# Altium schematic symbol library IC_ADI.SCHLIB: 3169 symbols (part 57 of 181) (continued)
## AD7549JP
designator U?
Dual 12-Bit uP-Compatible Digital-to-Analog Converter, 0 to +70 degC, P-20A, Tube; Generic Part Number: AD7549; PartNumber: AD7549JP; # DAC Outputs: 2; Max V+: 15.75V; Op Pwr Diss: 75mW; Resolution (Bits): 12; Settling Time: 1.5祍; Single Supply: Yes; DatasheetVersion: Rev.A; PackageVersion: Nov-2002; PackageReference: P-20A; PackageDescription: 20-Lead Plastic Leaded Chip Carrier [PLCC]; Supplier Part Number 1: AD7549JP-ND; Supplier Part Number 2: 584-AD7549JP; Packing: Tube; RoHS: N; Mounting Technology: Surface Mount; Code_JEDEC: MO-047-AA; ComponentLink1Description: Manufacturer URL; ComponentLink2Description: Datasheet; ComponentLink3Description: Package Specification; ComponentLink4Description: Product URL
footprint PLCC-20N (Footprint not found)
pins: 1 DB3 (in) "Data Bit 3, Data Bit 7 or Data Bit 11(MSB)", 2 DB2 (in) "Data Bit 2, Data Bit 6 or Data Bit 10.", 3 DB1 (in) "Data Bit 1, Data Bit 5 or Data Bit 9.", 4 DB0 (in) "Data Bit 0, Data Bit 4 or Data Bit 8.", 5 ~{UPD} (in) "Updates DAC Registers from 4-bit input registers. DAC A and DAC B both updated simultaneously.", 6 A2 (in) "Address line 2.", 7 A1 (in) "Address line 1.", 8 A0 (in) "Address line 0.", 9 ~{CS} (in) "Chip Select Input. Active low.", 10 ~{WR} (in) "Write Input. Active low.", 11 CLR (in) "Clear Input. Active High. Clears all registers.", 12 DGND (power) "Digital Ground.", 13 VREFB (in) "Voltage reference input to DAC B.", 14 RFBB (in) "Feedback resistor of DAC B.", 15 IOUTB (out) "Current output terminal of DAC B.", 16 AGND (power) "Analog ground.", 17 IOUTA (out) "Current output terminal of DAC A.", 18 RFBA (in) "Feedback resistor of DAC A.", 19 VREFA (in) "Voltage reference input to DAC A.", 20 VDD (power) "+15 V supply input."

## AD7549KN
designator U?
Dual 12-Bit uP-Compatible Digital-to-Analog Converter, 0 to +70 degC, N-20, Tube; Generic Part Number: AD7549; PartNumber: AD7549KN; # DAC Outputs: 2; Max V+: 15.75V; Op Pwr Diss: 75mW; Resolution (Bits): 12; Settling Time: 1.5祍; Single Supply: Yes; DatasheetVersion: Rev.A; PackageVersion: 070706-A; PackageReference: N-20; PackageDescription: 20-Lead Plastic Dual In-Line Package [PDIP] Narrow Body; Supplier Part Number 1: AD7549KN-ND; Supplier Part Number 2: 584-AD7549KN; Packing: Tube; RoHS: N; Mounting Technology: Through Hole; Code_JEDEC: MS-001; ComponentLink1Description: Manufacturer URL; ComponentLink2Description: Datasheet; ComponentLink3Description: Package Specification; ComponentLink4Description: Product URL
footprint DIP20 (Footprint not found)
pins: 1 DB3 (in) "Data Bit 3,Data Bit 7 or Data Bit 11 (MSB)", 2 DB2 (in) "Data Bit 2,Data Bit 6 or Data Bit 10.", 3 DB1 (in) "Data Bit 1,Data Bit 5 or Data Bit 9.", 4 DB0 (in) "Data Bit 0,Data Bit 4 or Data Bit 8.", 5 ~{UPD} (in) "Updates DAC Registers from 4-bit input registers.DAC A and DAC B both updated simultaneously.", 6 A2 (in) "Address line 2.", 7 A1 (in) "Address line 1.", 8 A0 (in) "Address line 0.", 9 ~{CS} (in) "Chip Sekect Input.Active low.", 10 ~{WR} (in) "Write Input.Active low.", 11 CLR (in) "Clear Input.Active High.Clears all registers.", 12 DGND (power) "Digital Ground.", 13 VREFB (in) "Voltage reference input to DAC B.", 14 RFBB (in) "Feedback resistor of DAC B.", 15 IOUTB (out) "Current output terminal of DAC B.", 16 AGND (power) "Analog ground.", 17 IOUTA (out) "Current output terminal of DAC A.", 18 RFBA (in) "Feedback resistor of DAC A.", 19 VREFA (in) "Voltage reference input to DAC A.", 20 VDD (power) "+15 V supply input."

## AD7549KPZ
designator U?
Dual 12-Bit uP-Compatible Digital-to-Analog Converter, 0 to +70 degC, P-20A, Pb-Free, Tube; Generic Part Number: AD7549; PartNumber: AD7549KPZ; # DAC Outputs: 2; Max V+: 15.75V; Op Pwr Diss: 75mW; Resolution (Bits): 12; Settling Time: 1.5祍; Single Supply: Yes; DatasheetVersion: Rev.A; PackageVersion: Nov-2002; PackageReference: P-20A; PackageDescription: 20-Lead Plastic Leaded Chip Carrier [PLCC]; Supplier Part Number 1: AD7549KPZ-ND; Supplier Part Number 2: 584-AD7549KPZ; Packing: Tube; RoHS: Y; Mounting Technology: Surface Mount; Code_JEDEC: MO-047-AA; ComponentLink1Description: Manufacturer URL; ComponentLink2Description: Datasheet; ComponentLink3Description: Package Specification; ComponentLink4Description: Product URL
footprint PLCC-20N (Footprint not found)
pins: 1 DB3 (in) "Data Bit 3, Data Bit 7 or Data Bit 11(MSB)", 2 DB2 (in) "Data Bit 2, Data Bit 6 or Data Bit 10.", 3 DB1 (in) "Data Bit 1, Data Bit 5 or Data Bit 9.", 4 DB0 (in) "Data Bit 0, Data Bit 4 or Data Bit 8.", 5 ~{UPD} (in) "Updates DAC Registers from 4-bit input registers. DAC A and DAC B both updated simultaneously.", 6 A2 (in) "Address line 2.", 7 A1 (in) "Address line 1.", 8 A0 (in) "Address line 0.", 9 ~{CS} (in) "Chip Select Input. Active low.", 10 ~{WR} (in) "Write Input. Active low.", 11 CLR (in) "Clear Input. Active High. Clears all registers.", 12 DGND (power) "Digital Ground.", 13 VREFB (in) "Voltage reference input to DAC B.", 14 RFBB (in) "Feedback resistor of DAC B.", 15 IOUTB (out) "Current output terminal of DAC B.", 16 AGND (power) "Analog ground.", 17 IOUTA (out) "Current output terminal of DAC A.", 18 RFBA (in) "Feedback resistor of DAC A.", 19 VREFA (in) "Voltage reference input to DAC A.", 20 VDD (power) "+15 V supply input."

## AD7564AR-B
designator U?
Quad 12-Bit Low Power Digital-to-Analog Converter, 3.3 V / 5 V, 0 to 70 degC, RW-28, Tube; Generic Part Number: AD7564; PartNumber: AD7564AR-B; # DAC Outputs: 4; Max V+: 5.5V; Op Pwr Diss: 50礧; Resolution (Bits): 12; Settling Time: 550ns; Single Supply: Yes; DatasheetVersion: Rev.B; PackageVersion: 060706-A; PackageReference: RW-28; PackageDescription: 28-Lead Standard Small Outline Package [SOIC_W]; Supplier Part Number 1: AD7564AR-B-ND; Supplier Part Number 2: 584-AD7564AR-B; Packing: Tube; RoHS: N; Mounting Technology: Surface Mount; Code_JEDEC: MS-013-AE; ComponentLink1Description: Manufacturer URL; ComponentLink2Description: Datasheet; ComponentLink3Description: Product URL
footprint SOIC28W_1.27 (Footprint not found)
pins: 1 DGND (power) "Digital Ground.", 2 IOUT2C "IOUT2 terminal for DAC C. This should normally connect to the signal ground of the system.", 3 VDD (power) "Positive power supply. This is +5 V +/- 5%.", 4 IOUT1C (out) "IOUT1 terminal for DAC C.", 5 RFBC (in) "Feedback resistor for DAC C.", 6 VREFC (in) "DAC C reference input.", 7 IOUT2D "IOUT2 terminal for DAC D. This should normally connect to the signal ground of the system.", 8 IOUT1D (out) "IOUT1 terminal for DAC D.", 9 RFBD (in) "Feedback resistor for DAC D.", 10 VREFD (in) "DAC D reference input.", 11 SDOUT (out) "This shift register output allows multiple devices to be connected in a daisy chain configuration.", 12 ~{CLR} (in) "Asynchronous C\L\R\ input. When this input is taken low, all DAC latches are loaded with all 0s.", 13 ~{LDAC} (in) "Asynchronous L\D\A\C\ input. When this input is taken low, all DAC latches are simultaneously updated with the contents of the input latches.", 14 ~{FSIN} (in) "Level-triggered control input (active low). This is the frame synchronization signal for the input data. When F\S\I\N\ goes low, it enables the input shift register, and data is transferred on the falling edges of CLKIN. If (See Datasheet)", 15 SDIN (in) "Serial data input. The device accepts a 16-bit word. DB0 and DB1 are DAC select bits. DB2 and DB3 are device address bits. DB4 to DB15 contain the 12-bit data to be loaded to the selected DAC.", 16 CLKIN (in) "Clock Input. Data is clocked into the input shift register on the falling edges of CLKIN. Add a pull-down resistor on the clock line to avoid timing issues.", 17 A1 (in) "Device address pin. This input in association with A0 gives the device an address. If DB2 and DB3 of the serial input stream do not correspond to this address, the data which follows is ignored and not loaded to any input (See Datasheet)", 18 A0 (in) "Device address pin. This input in association with A1 gives the device an address.", 19 VREFA (in) "DAC A reference input.", 20 RFBA (in) "Feedback resistor for DAC A.", 21 IOUT1A (out) "IOUT1 terminal for DAC A.", 22 IOUT2A "IOUT2 terminal for DAC A. This should normally connect to the signal ground of the system.", 23 VREFB (in) "DAC B reference input.", 24 RFBB (in) "Feedback resistor for DAC B.", 25 IOUT1B (out) "IOUT1 terminal for DAC B.", 26 N/C "No Connect pin.", 27 AGND (power) "This pin connects to the back gates of the current steering switches. It should be connected to the signal ground of the system.", 28 IOUT2B "IOUT2 terminal for DAC B. This should normally connect to the signal ground of the system."

## AD7564ARS-B
designator U?
Quad 12-Bit Low Power Digital-to-Analog Converter, 3.3 V / 5 V, -40 to +85 degC, RS-28, Tube; Generic Part Number: AD7564; PartNumber: AD7564ARS-B; # DAC Outputs: 4; Max V+: 5.5V; Op Pwr Diss: 50礧; Resolution (Bits): 12; Settling Time: 550ns; Single Supply: Yes; DatasheetVersion: Rev.B; PackageVersion: 060106-A; PackageReference: RS-28; PackageDescription: 28-Lead Shrink Small Outline Package [SSOP]; Supplier Part Number 1: AD7564ARS-B-ND; Supplier Part Number 2: 584-AD7564ARS-B; Packing: Tube; RoHS: N; Mounting Technology: Surface Mount; Code_JEDEC: MO-150-AH; ComponentLink1Description: Manufacturer URL; ComponentLink2Description: Datasheet; ComponentLink3Description: Package Specification; ComponentLink4Description: Product URL
footprint SSOP28_0.65 (Footprint not found)
pins: 1 DGND (power) "Digital Ground.", 2 IOUT2C "IOUT2 terminal for DAC C. This should normally connect to the signal ground of the system.", 3 VDD (power) "Positive power supply. This is +5 V +/- 5%.", 4 IOUT1C (out) "IOUT1 terminal for DAC C.", 5 RFBC (in) "Feedback resistor for DAC C.", 6 VREFC (in) "DAC C reference input.", 7 IOUT2D "IOUT2 terminal for DAC D. This should normally connect to the signal ground of the system.", 8 IOUT1D (out) "IOUT1 terminal for DAC D.", 9 RFBD (in) "Feedback resistor for DAC D.", 10 VREFD (in) "DAC D reference input.", 11 SDOUT (out) "This shift register output allows multiple devices to be connected in a daisy chain configuration.", 12 ~{CLR} (in) "Asynchronous C\L\R\ input. When this input is taken low, all DAC latches are loaded with all 0s.", 13 ~{LDAC} (in) "Asynchronous L\D\A\C\ input. When this input is taken low, all DAC latches are simultaneously updated with the contents of the input latches.", 14 ~{FSIN} (in) "Level-triggered control input (active low). This is the frame synchronization signal for the input data. When F\S\I\N\ goes low, it enables the input shift register, and data is transferred on the falling edges of CLKIN. If (See Datasheet)", 15 SDIN (in) "Serial data input. The device accepts a 16-bit word. DB0 and DB1 are DAC select bits. DB2 and DB3 are device address bits. DB4 to DB15 contain the 12-bit data to be loaded to the selected DAC.", 16 CLKIN (in) "Clock Input. Data is clocked into the input shift register on the falling edges of CLKIN. Add a pull-down resistor on the clock line to avoid timing issues.", 17 A1 (in) "Device address pin. This input in association with A0 gives the device an address. If DB2 and DB3 of the serial input stream do not correspond to this address, the data which follows is ignored and not loaded to any input (See Datasheet)", 18 A0 (in) "Device address pin. This input in association with A1 gives the device an address.", 19 VREFA (in) "DAC A reference input.", 20 RFBA (in) "Feedback resistor for DAC A.", 21 IOUT1A (out) "IOUT1 terminal for DAC A.", 22 IOUT2A "IOUT2 terminal for DAC A. This should normally connect to the signal ground of the system.", 23 VREFB (in) "DAC B reference input.", 24 RFBB (in) "Feedback resistor for DAC B.", 25 IOUT1B (out) "IOUT1 terminal for DAC B.", 26 N/C "No Connect pin.", 27 AGND (power) "This pin connects to the back gates of the current steering switches. It should be connected to the signal ground of the system.", 28 IOUT2B "IOUT2 terminal for DAC B. This should normally connect to the signal ground of the system."

## AD7564ARSZ-B
designator U?
Quad 12-Bit Low Power Digital-to-Analog Converter, 3.3 V / 5 V, -40 to +85 degC, RS-28, Pb-Free, Tube; Generic Part Number: AD7564; PartNumber: AD7564ARSZ-B; # DAC Outputs: 4; Max V+: 5.5V; Op Pwr Diss: 50礧; Resolution (Bits): 12; Settling Time: 550ns; Single Supply: Yes; DatasheetVersion: Rev.B; PackageVersion: 060106-A; PackageReference: RS-28; PackageDescription: 28-Lead Shrink Small Outline Package [SSOP]; Supplier Part Number 1: AD7564ARSZ-B-ND; Supplier Part Number 2: 59K5046; Supplier Part Number 3: 584-AD7564ARSZ-B; Packing: Tube; RoHS: Y; Mounting Technology: Surface Mount; Code_JEDEC: MO-150-AH; ComponentLink1Description: Manufacturer URL; ComponentLink2Description: Datasheet; ComponentLink3Description: Package Specification; ComponentLink4Description: Product URL
footprint SSOP28_0.65 (Footprint not found)
pins: 1 DGND (power) "Digital Ground.", 2 IOUT2C "IOUT2 terminal for DAC C. This should normally connect to the signal ground of the system.", 3 VDD (power) "Positive power supply. This is +5 V +/- 5%.", 4 IOUT1C (out) "IOUT1 terminal for DAC C.", 5 RFBC (in) "Feedback resistor for DAC C.", 6 VREFC (in) "DAC C reference input.", 7 IOUT2D "IOUT2 terminal for DAC D. This should normally connect to the signal ground of the system.", 8 IOUT1D (out) "IOUT1 terminal for DAC D.", 9 RFBD (in) "Feedback resistor for DAC D.", 10 VREFD (in) "DAC D reference input.", 11 SDOUT (out) "This shift register output allows multiple devices to be connected in a daisy chain configuration.", 12 ~{CLR} (in) "Asynchronous C\L\R\ input. When this input is taken low, all DAC latches are loaded with all 0s.", 13 ~{LDAC} (in) "Asynchronous L\D\A\C\ input. When this input is taken low, all DAC latches are simultaneously updated with the contents of the input latches.", 14 ~{FSIN} (in) "Level-triggered control input (active low). This is the frame synchronization signal for the input data. When F\S\I\N\ goes low, it enables the input shift register, and data is transferred on the falling edges of CLKIN. If (See Datasheet)", 15 SDIN (in) "Serial data input. The device accepts a 16-bit word. DB0 and DB1 are DAC select bits. DB2 and DB3 are device address bits. DB4 to DB15 contain the 12-bit data to be loaded to the selected DAC.", 16 CLKIN (in) "Clock Input. Data is clocked into the input shift register on the falling edges of CLKIN. Add a pull-down resistor on the clock line to avoid timing issues.", 17 A1 (in) "Device address pin. This input in association with A0 gives the device an address. If DB2 and DB3 of the serial input stream do not correspond to this address, the data which follows is ignored and not loaded to any input (See Datasheet)", 18 A0 (in) "Device address pin. This input in association with A1 gives the device an address.", 19 VREFA (in) "DAC A reference input.", 20 RFBA (in) "Feedback resistor for DAC A.", 21 IOUT1A (out) "IOUT1 terminal for DAC A.", 22 IOUT2A "IOUT2 terminal for DAC A. This should normally connect to the signal ground of the system.", 23 VREFB (in) "DAC B reference input.", 24 RFBB (in) "Feedback resistor for DAC B.", 25 IOUT1B (out) "IOUT1 terminal for DAC B.", 26 N/C "No Connect pin.", 27 AGND (power) "This pin connects to the back gates of the current steering switches. It should be connected to the signal ground of the system.", 28 IOUT2B "IOUT2 terminal for DAC B. This should normally connect to the signal ground of the system."

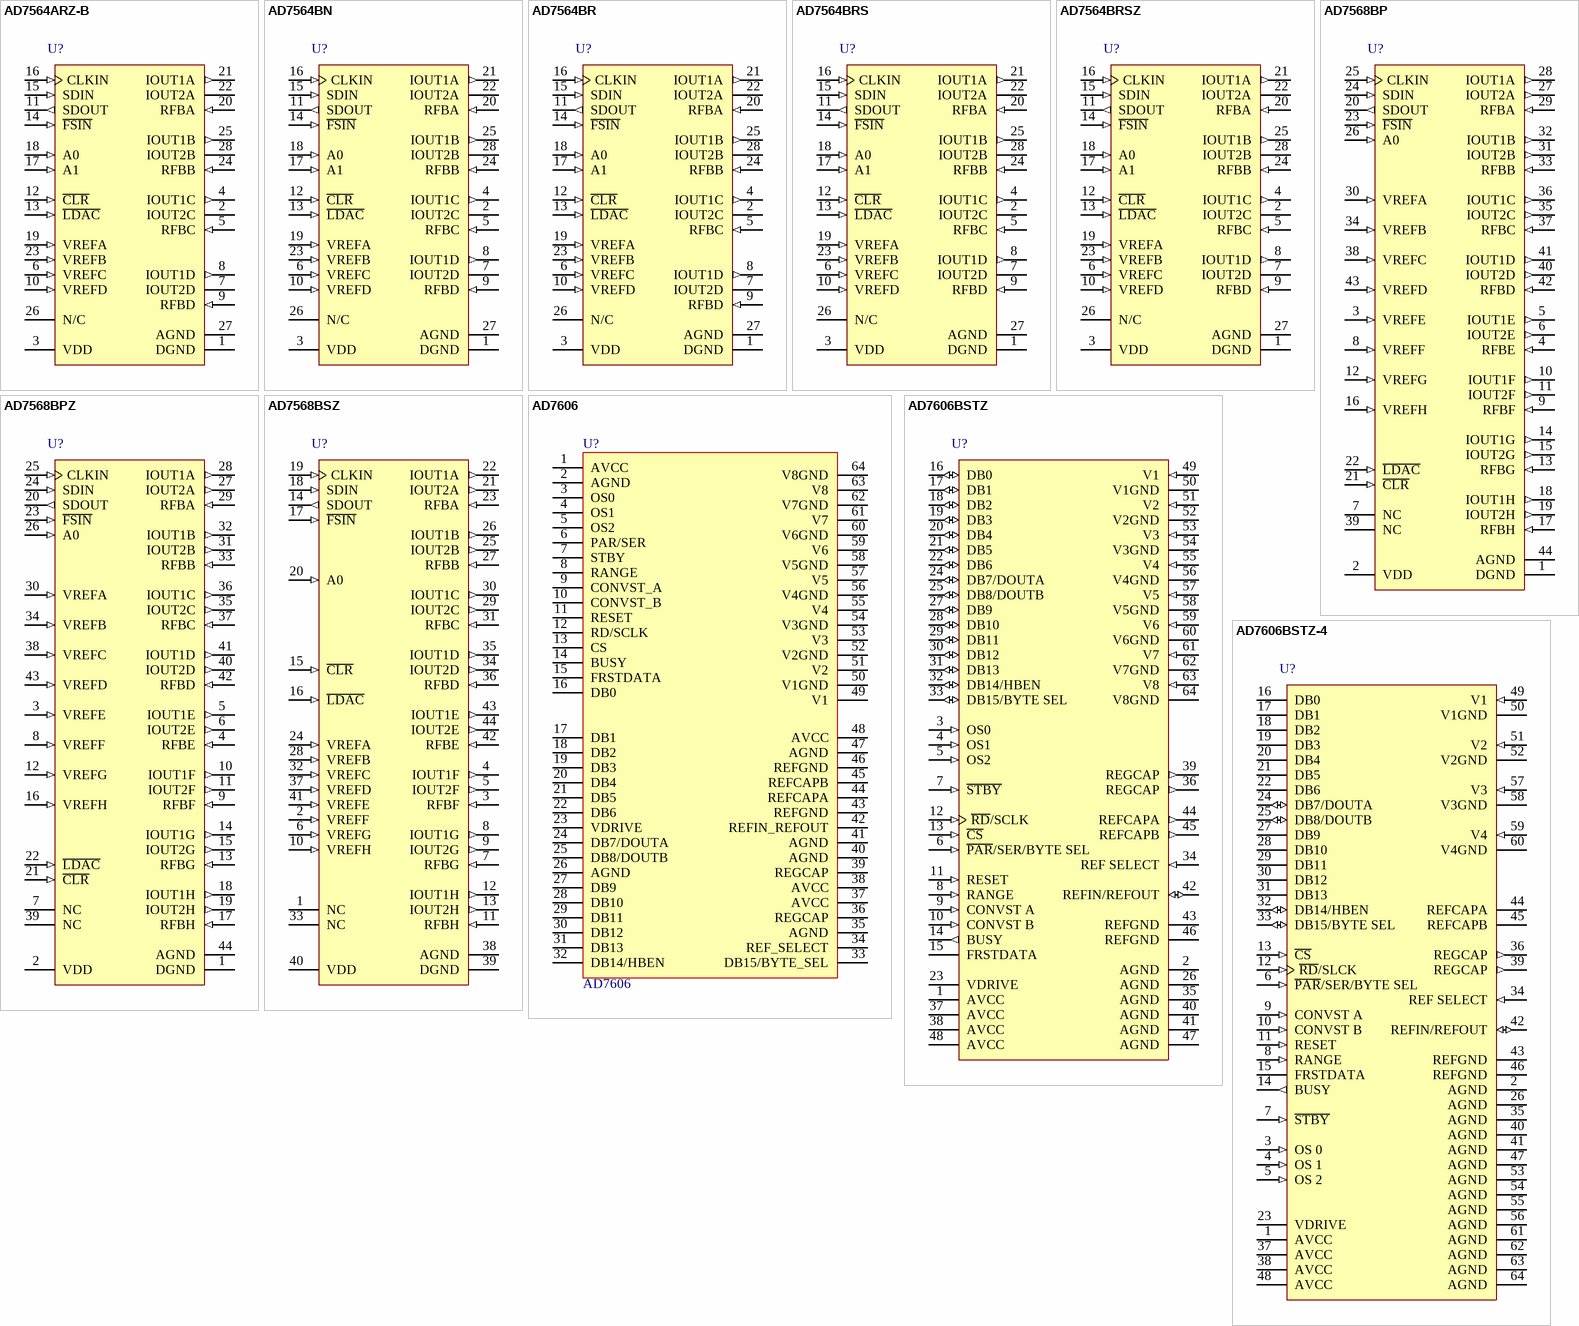
[diagram p49: symbols AD7564ARZ-B to AD7606BSTZ-4]

## AD7564ARZ-B
designator U?
Quad 12-Bit Low Power Digital-to-Analog Converter, 3.3 V / 5 V, 0 to 70 degC, RW-28, Pb-Free, Tube; Generic Part Number: AD7564; PartNumber: AD7564ARZ-B; # DAC Outputs: 4; Max V+: 5.5V; Op Pwr Diss: 50礧; Resolution (Bits): 12; Settling Time: 550ns; Single Supply: Yes; DatasheetVersion: Rev.B; PackageVersion: 060706-A; PackageReference: RW-28; PackageDescription: 28-Lead Standard Small Outline Package [SOIC_W]; Supplier Part Number 1: AD7564ARZ-B-ND; Supplier Part Number 2: 584-AD7564ARZ-B; Packing: Tube; RoHS: Y; Mounting Technology: Surface Mount; Code_JEDEC: MS-013-AE; ComponentLink1Description: Manufacturer URL; ComponentLink2Description: Datasheet; ComponentLink3Description: Product URL
footprint SOIC28W_1.27 (Footprint not found)
pins: 1 DGND (power) "Digital Ground.", 2 IOUT2C "IOUT2 terminal for DAC C. This should normally connect to the signal ground of the system.", 3 VDD (power) "Positive power supply. This is +5 V +/- 5%.", 4 IOUT1C (out) "IOUT1 terminal for DAC C.", 5 RFBC (in) "Feedback resistor for DAC C.", 6 VREFC (in) "DAC C reference input.", 7 IOUT2D "IOUT2 terminal for DAC D. This should normally connect to the signal ground of the system.", 8 IOUT1D (out) "IOUT1 terminal for DAC D.", 9 RFBD (in) "Feedback resistor for DAC D.", 10 VREFD (in) "DAC D reference input.", 11 SDOUT (out) "This shift register output allows multiple devices to be connected in a daisy chain configuration.", 12 ~{CLR} (in) "Asynchronous C\L\R\ input. When this input is taken low, all DAC latches are loaded with all 0s.", 13 ~{LDAC} (in) "Asynchronous L\D\A\C\ input. When this input is taken low, all DAC latches are simultaneously updated with the contents of the input latches.", 14 ~{FSIN} (in) "Level-triggered control input (active low). This is the frame synchronization signal for the input data. When F\S\I\N\ goes low, it enables the input shift register, and data is transferred on the falling edges of CLKIN. If (See Datasheet)", 15 SDIN (in) "Serial data input. The device accepts a 16-bit word. DB0 and DB1 are DAC select bits. DB2 and DB3 are device address bits. DB4 to DB15 contain the 12-bit data to be loaded to the selected DAC.", 16 CLKIN (in) "Clock Input. Data is clocked into the input shift register on the falling edges of CLKIN. Add a pull-down resistor on the clock line to avoid timing issues.", 17 A1 (in) "Device address pin. This input in association with A0 gives the device an address. If DB2 and DB3 of the serial input stream do not correspond to this address, the data which follows is ignored and not loaded to any input (See Datasheet)", 18 A0 (in) "Device address pin. This input in association with A1 gives the device an address.", 19 VREFA (in) "DAC A reference input.", 20 RFBA (in) "Feedback resistor for DAC A.", 21 IOUT1A (out) "IOUT1 terminal for DAC A.", 22 IOUT2A "IOUT2 terminal for DAC A. This should normally connect to the signal ground of the system.", 23 VREFB (in) "DAC B reference input.", 24 RFBB (in) "Feedback resistor for DAC B.", 25 IOUT1B (out) "IOUT1 terminal for DAC B.", 26 N/C "No Connect pin.", 27 AGND (power) "This pin connects to the back gates of the current steering switches. It should be connected to the signal ground of the system.", 28 IOUT2B "IOUT2 terminal for DAC B. This should normally connect to the signal ground of the system."

## AD7564BN
designator U?
Quad 12-Bit Low Power Digital-to-Analog Converter, 3.3 V / 5 V, -40 to +85 degC, N-28-2, Tube; Generic Part Number: AD7564; PartNumber: AD7564BN; # DAC Outputs: 4; Max V+: 5.5V; Op Pwr Diss: 50礧; Resolution (Bits): 12; Settling Time: 550ns; Single Supply: Yes; DatasheetVersion: Rev.B; PackageVersion: 071006-A; PackageReference: N-28-2; PackageDescription: 28-Lead Plastic Dual In-Line Package [PDIP]; Supplier Part Number 1: AD7564BN-ND; Supplier Part Number 2: 584-AD7564BN; Packing: Tube; RoHS: N; Mounting Technology: Through Hole; Code_JEDEC: MS-011; ComponentLink1Description: Manufacturer URL; ComponentLink2Description: Datasheet; ComponentLink3Description: Package Specification; ComponentLink4Description: Product URL
footprint DIP28W
pins: 1 DGND (power) "Digital Ground.", 2 IOUT2C "IOUT2 terminal for DAC C. This should normally connect to the signal ground of the system.", 3 VDD (power) "Positive power supply. This is +5 V +/- 5%.", 4 IOUT1C (out) "IOUT1 terminal for DAC C.", 5 RFBC (in) "Feedback resistor for DAC C.", 6 VREFC (in) "DAC C reference input.", 7 IOUT2D "IOUT2 terminal for DAC D. This should normally connect to the signal ground of the system.", 8 IOUT1D (out) "IOUT1 terminal for DAC D.", 9 RFBD (in) "Feedback resistor for DAC D.", 10 VREFD (in) "DAC D reference input.", 11 SDOUT (out) "This shift register output allows multiple devices to be connected in a daisy chain configuration.", 12 ~{CLR} (in) "Asynchronous C\L\R\ input. When this input is taken low, all DAC latches are loaded with all 0s.", 13 ~{LDAC} (in) "Asynchronous L\D\A\C\ input. When this input is taken low, all DAC latches are simultaneously updated with the contents of the input latches.", 14 ~{FSIN} (in) "Level-triggered control input (active low). This is the frame synchronization signal for the input data. When F\S\I\N\ goes low, it enables the input shift register, and data is transferred on the falling edges of CLKIN. If (See Datasheet)", 15 SDIN (in) "Serial data input. The device accepts a 16-bit word. DB0 and DB1 are DAC select bits. DB2 and DB3 are device address bits. DB4 to DB15 contain the 12-bit data to be loaded to the selected DAC.", 16 CLKIN (in) "Clock Input. Data is clocked into the input shift register on the falling edges of CLKIN. Add a pull-down resistor on the clock line to avoid timing issues.", 17 A1 (in) "Device address pin. This input in association with A0 gives the device an address. If DB2 and DB3 of the serial input stream do not correspond to this address, the data which follows is ignored and not loaded to any input (See Datasheet)", 18 A0 (in) "Device address pin. This input in association with A1 gives the device an address.", 19 VREFA (in) "DAC A reference input.", 20 RFBA (in) "Feedback resistor for DAC A.", 21 IOUT1A (out) "IOUT1 terminal for DAC A.", 22 IOUT2A "IOUT2 terminal for DAC A. This should normally connect to the signal ground of the system.", 23 VREFB (in) "DAC B reference input.", 24 RFBB (in) "Feedback resistor for DAC B.", 25 IOUT1B (out) "IOUT1 terminal for DAC B.", 26 N/C "No Connect pin.", 27 AGND (power) "This pin connects to the back gates of the current steering switches. It should be connected to the signal ground of the system.", 28 IOUT2B "IOUT2 terminal for DAC B. This should normally connect to the signal ground of the system."

## AD7564BR
designator U?
Quad 12-Bit Low Power Digital-to-Analog Converter, 3.3 V / 5 V, 0 to 70 degC, RW-28, Tube; Generic Part Number: AD7564; PartNumber: AD7564BR; # DAC Outputs: 4; Max V+: 5.5V; Op Pwr Diss: 50礧; Resolution (Bits): 12; Settling Time: 550ns; Single Supply: Yes; DatasheetVersion: Rev.B; PackageVersion: 060706-A; PackageReference: RW-28; PackageDescription: 28-Lead Standard Small Outline Package [SOIC_W]; Supplier Part Number 1: AD7564BR-ND; Supplier Part Number 2: 584-AD7564BR; Packing: Tube; RoHS: N; Mounting Technology: Surface Mount; Code_JEDEC: MS-013-AE; ComponentLink1Description: Manufacturer URL; ComponentLink2Description: Datasheet; ComponentLink3Description: Product URL
footprint SOIC28W_1.27 (Footprint not found)
pins: 1 DGND (power) "Digital Ground.", 2 IOUT2C "IOUT2 terminal for DAC C. This should normally connect to the signal ground of the system.", 3 VDD (power) "Positive power supply. This is +5 V +/- 5%.", 4 IOUT1C (out) "IOUT1 terminal for DAC C.", 5 RFBC (in) "Feedback resistor for DAC C.", 6 VREFC (in) "DAC C reference input.", 7 IOUT2D "IOUT2 terminal for DAC D. This should normally connect to the signal ground of the system.", 8 IOUT1D (out) "IOUT1 terminal for DAC D.", 9 RFBD (in) "Feedback resistor for DAC D.", 10 VREFD (in) "DAC D reference input.", 11 SDOUT (out) "This shift register output allows multiple devices to be connected in a daisy chain configuration.", 12 ~{CLR} (in) "Asynchronous C\L\R\ input. When this input is taken low, all DAC latches are loaded with all 0s.", 13 ~{LDAC} (in) "Asynchronous L\D\A\C\ input. When this input is taken low, all DAC latches are simultaneously updated with the contents of the input latches.", 14 ~{FSIN} (in) "Level-triggered control input (active low). This is the frame synchronization signal for the input data. When F\S\I\N\ goes low, it enables the input shift register, and data is transferred on the falling edges of CLKIN. If (See Datasheet)", 15 SDIN (in) "Serial data input. The device accepts a 16-bit word. DB0 and DB1 are DAC select bits. DB2 and DB3 are device address bits. DB4 to DB15 contain the 12-bit data to be loaded to the selected DAC.", 16 CLKIN (in) "Clock Input. Data is clocked into the input shift register on the falling edges of CLKIN. Add a pull-down resistor on the clock line to avoid timing issues.", 17 A1 (in) "Device address pin. This input in association with A0 gives the device an address. If DB2 and DB3 of the serial input stream do not correspond to this address, the data which follows is ignored and not loaded to any input (See Datasheet)", 18 A0 (in) "Device address pin. This input in association with A1 gives the device an address.", 19 VREFA (in) "DAC A reference input.", 20 RFBA (in) "Feedback resistor for DAC A.", 21 IOUT1A (out) "IOUT1 terminal for DAC A.", 22 IOUT2A "IOUT2 terminal for DAC A. This should normally connect to the signal ground of the system.", 23 VREFB (in) "DAC B reference input.", 24 RFBB (in) "Feedback resistor for DAC B.", 25 IOUT1B (out) "IOUT1 terminal for DAC B.", 26 N/C "No Connect pin.", 27 AGND (power) "This pin connects to the back gates of the current steering switches. It should be connected to the signal ground of the system.", 28 IOUT2B "IOUT2 terminal for DAC B. This should normally connect to the signal ground of the system."

## AD7564BRS
designator U?
Quad 12-Bit Low Power Digital-to-Analog Converter, 3.3 V / 5 V, 0 to 70 degC, RS-28, Tube; Generic Part Number: AD7564; PartNumber: AD7564BRS; # DAC Outputs: 4; Max V+: 5.5V; Op Pwr Diss: 50礧; Resolution (Bits): 12; Settling Time: 550ns; Single Supply: Yes; DatasheetVersion: Rev.B; PackageVersion: 060106-A; PackageReference: RS-28; PackageDescription: 28-Lead Shrink Small Outline Package [SSOP]; Supplier Part Number 1: AD7564BRS-ND; Supplier Part Number 2: 584-AD7564BRS; Packing: Tube; RoHS: N; Mounting Technology: Surface Mount; Code_JEDEC: MO-150-AH; ComponentLink1Description: Manufacturer URL; ComponentLink2Description: Datasheet; ComponentLink3Description: Package Specification; ComponentLink4Description: Product URL
footprint SSOP28_0.65 (Footprint not found)
pins: 1 DGND (power) "Digital Ground.", 2 IOUT2C "IOUT2 terminal for DAC C. This should normally connect to the signal ground of the system.", 3 VDD (power) "Positive power supply. This is +5 V +/- 5%.", 4 IOUT1C (out) "IOUT1 terminal for DAC C.", 5 RFBC (in) "Feedback resistor for DAC C.", 6 VREFC (in) "DAC C reference input.", 7 IOUT2D "IOUT2 terminal for DAC D. This should normally connect to the signal ground of the system.", 8 IOUT1D (out) "IOUT1 terminal for DAC D.", 9 RFBD (in) "Feedback resistor for DAC D.", 10 VREFD (in) "DAC D reference input.", 11 SDOUT (out) "This shift register output allows multiple devices to be connected in a daisy chain configuration.", 12 ~{CLR} (in) "Asynchronous C\L\R\ input. When this input is taken low, all DAC latches are loaded with all 0s.", 13 ~{LDAC} (in) "Asynchronous L\D\A\C\ input. When this input is taken low, all DAC latches are simultaneously updated with the contents of the input latches.", 14 ~{FSIN} (in) "Level-triggered control input (active low). This is the frame synchronization signal for the input data. When F\S\I\N\ goes low, it enables the input shift register, and data is transferred on the falling edges of CLKIN. If (See Datasheet)", 15 SDIN (in) "Serial data input. The device accepts a 16-bit word. DB0 and DB1 are DAC select bits. DB2 and DB3 are device address bits. DB4 to DB15 contain the 12-bit data to be loaded to the selected DAC.", 16 CLKIN (in) "Clock Input. Data is clocked into the input shift register on the falling edges of CLKIN. Add a pull-down resistor on the clock line to avoid timing issues.", 17 A1 (in) "Device address pin. This input in association with A0 gives the device an address. If DB2 and DB3 of the serial input stream do not correspond to this address, the data which follows is ignored and not loaded to any input (See Datasheet)", 18 A0 (in) "Device address pin. This input in association with A1 gives the device an address.", 19 VREFA (in) "DAC A reference input.", 20 RFBA (in) "Feedback resistor for DAC A.", 21 IOUT1A (out) "IOUT1 terminal for DAC A.", 22 IOUT2A "IOUT2 terminal for DAC A. This should normally connect to the signal ground of the system.", 23 VREFB (in) "DAC B reference input.", 24 RFBB (in) "Feedback resistor for DAC B.", 25 IOUT1B (out) "IOUT1 terminal for DAC B.", 26 N/C "No Connect pin.", 27 AGND (power) "This pin connects to the back gates of the current steering switches. It should be connected to the signal ground of the system.", 28 IOUT2B "IOUT2 terminal for DAC B. This should normally connect to the signal ground of the system."

## AD7564BRSZ
designator U?
Quad 12-Bit Low Power Digital-to-Analog Converter, 3.3 V / 5 V, 0 to 70 degC, RS-28, Pb-Free, Tube; Generic Part Number: AD7564; PartNumber: AD7564BRSZ; # DAC Outputs: 4; Max V+: 5.5V; Op Pwr Diss: 50礧; Resolution (Bits): 12; Settling Time: 550ns; Single Supply: Yes; DatasheetVersion: Rev.B; PackageVersion: 060106-A; PackageReference: RS-28; PackageDescription: 28-Lead Shrink Small Outline Package [SSOP]; Supplier Part Number 1: AD7564BRSZ-ND; Supplier Part Number 2: 2305685; Supplier Part Number 3: 59K5050; Supplier Part Number 4: 584-AD7564BRSZ; Packing: Tube; RoHS: Y; Mounting Technology: Surface Mount; Code_JEDEC: MO-150-AH; ComponentLink1Description: Manufacturer URL; ComponentLink2Description: Datasheet; ComponentLink3Description: Package Specification; ComponentLink4Description: Product URL
footprint SSOP28_0.65 (Footprint not found)
pins: 1 DGND (power) "Digital Ground.", 2 IOUT2C "IOUT2 terminal for DAC C. This should normally connect to the signal ground of the system.", 3 VDD (power) "Positive power supply. This is +5 V +/- 5%.", 4 IOUT1C (out) "IOUT1 terminal for DAC C.", 5 RFBC (in) "Feedback resistor for DAC C.", 6 VREFC (in) "DAC C reference input.", 7 IOUT2D "IOUT2 terminal for DAC D. This should normally connect to the signal ground of the system.", 8 IOUT1D (out) "IOUT1 terminal for DAC D.", 9 RFBD (in) "Feedback resistor for DAC D.", 10 VREFD (in) "DAC D reference input.", 11 SDOUT (out) "This shift register output allows multiple devices to be connected in a daisy chain configuration.", 12 ~{CLR} (in) "Asynchronous C\L\R\ input. When this input is taken low, all DAC latches are loaded with all 0s.", 13 ~{LDAC} (in) "Asynchronous L\D\A\C\ input. When this input is taken low, all DAC latches are simultaneously updated with the contents of the input latches.", 14 ~{FSIN} (in) "Level-triggered control input (active low). This is the frame synchronization signal for the input data. When F\S\I\N\ goes low, it enables the input shift register, and data is transferred on the falling edges of CLKIN. If (See Datasheet)", 15 SDIN (in) "Serial data input. The device accepts a 16-bit word. DB0 and DB1 are DAC select bits. DB2 and DB3 are device address bits. DB4 to DB15 contain the 12-bit data to be loaded to the selected DAC.", 16 CLKIN (in) "Clock Input. Data is clocked into the input shift register on the falling edges of CLKIN. Add a pull-down resistor on the clock line to avoid timing issues.", 17 A1 (in) "Device address pin. This input in association with A0 gives the device an address. If DB2 and DB3 of the serial input stream do not correspond to this address, the data which follows is ignored and not loaded to any input (See Datasheet)", 18 A0 (in) "Device address pin. This input in association with A1 gives the device an address.", 19 VREFA (in) "DAC A reference input.", 20 RFBA (in) "Feedback resistor for DAC A.", 21 IOUT1A (out) "IOUT1 terminal for DAC A.", 22 IOUT2A "IOUT2 terminal for DAC A. This should normally connect to the signal ground of the system.", 23 VREFB (in) "DAC B reference input.", 24 RFBB (in) "Feedback resistor for DAC B.", 25 IOUT1B (out) "IOUT1 terminal for DAC B.", 26 N/C "No Connect pin.", 27 AGND (power) "This pin connects to the back gates of the current steering switches. It should be connected to the signal ground of the system.", 28 IOUT2B "IOUT2 terminal for DAC B. This should normally connect to the signal ground of the system."